# Altium footprint library HamedLib.PcbLib: 221 footprints (part 6 of 14)
Each footprint in its own frame and in the unit in brackets; x right, y up, seen from the top. Pads: shape width x height; smd on the part's side, far side on the other; paste and mask are expansions set on the pad; w line width, h text height; cw(c..) or ccw(c..) is an arc to the next point about the centre after c.
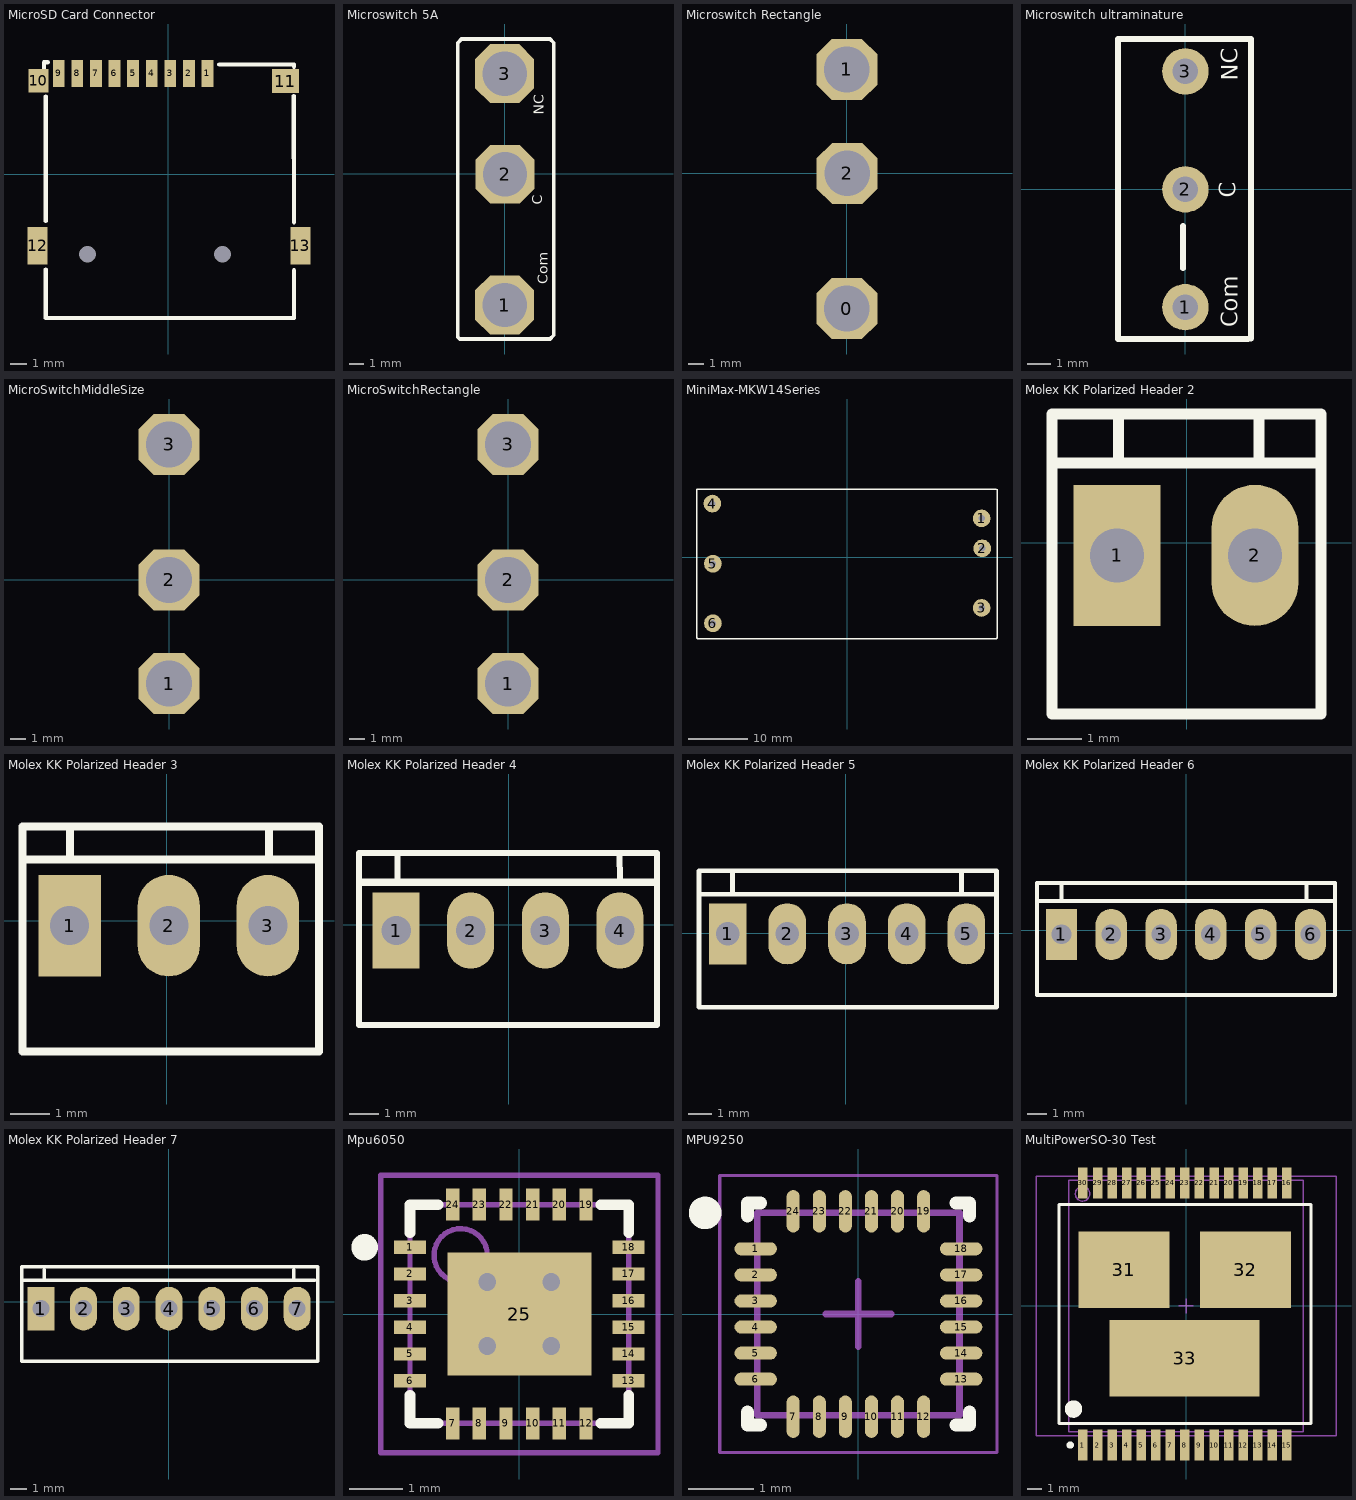
[diagram p5: the footprints below, top view; thin cyan lines are the x and y axes]

## MicroSD Card Connector [mm] "JavanElec MicroSD Card Connector"
pads (15):
  rect 0.7x1.6 smd: 1(2.328,5.961) 2(1.228,5.961) 3(0.128,5.961) 4(-0.972,5.961) 5(-2.072,5.961) 6(-3.172,5.961) 7(-4.272,5.961) 8(-5.372,5.961) 9(-6.472,5.961)
  rect 1.2x1.4 smd: 10(-7.671,5.537)
  rect 1.6x1.4 smd: 11(6.934,5.512)
  rect 1.2x2.2 smd: 12(-7.722,-4.239) 13(7.828,-4.239)
  round 0 hole 1: 14(-4.772,-4.739) 15(3.228,-4.739)
Top Overlay:
  lines w0.254: -7.341,6.261 -7.341,6.629 -7.122,6.629 ; -7.247,-5.639 -7.247,-8.514 7.453,-8.514 7.453,-5.689 ; -7.247,-2.764 -7.239,4.597 ; 3.028,6.486 7.453,6.486 7.453,6.361 ; 7.442,4.623 7.453,-2.839
3D body "User Library-micro-sd-card.step": height 2.2, standoff -0.5, extent -7.896,-10.657 8.204,6.543

## Microswitch 5A [mm]
pads (3):
  oct 4x4 hole 3: 1(0,-8.9) 2(0.025,-0.025) 3(0,6.8)
Top Overlay:
  lines w0.254: 3.325,8.775 3.325,-10.95 3.075,-11.2 -3.05,-11.2 -3.175,-11.075 -3.175,8.9 -2.925,9.15 3.075,9.15 3.325,8.9
  text "Com" at 2.925,-7.5 h0.7
  text "C" at 2.55,-2.1 h0.7
  text "NC" at 2.65,4 h0.7
3D body "Mircoswitch 5A.STEP": height 11, standoff -4.87, extent -3.15,-10.8 3.25,9.15

## Microswitch Rectangle [mm]
pads (3):
  oct 4x4 hole 3: 0(0,-8.9) 1(0,6.8) 2(0.025,-0.025)
3D body "MicroSwitch Rectangle.step": height 17.36, standoff -0.9, extent -3.15,-11.017 3.25,8.883

## Microswitch ultraminature [mm]
pads (3):
  round 2 hole 1.1: 1(0,-5.08) 2(0,0) 3(0,5.08)
Top Overlay:
  lines w0.254: -0.1,-3.4 -0.1,-1.575 ; 2.7,-6.45 -2.9,-6.45 -2.9,6.475 2.825,6.475 2.825,-6.425
  text "NC" at 2.25,4.675 h0.7
  text "C" at 2.175,-0.375 h0.7
  text "Com" at 2.25,-5.95 h0.7
3D body "UltraMiniature Microswitch.STEP": height 14.49, standoff -3.5, extent -2.9,-6.4 2.9,6.4

## MicroSwitchMiddleSize [mm]
height 22
pads (3):
  oct 4x4 hole 3: 1(0,-6.8) 2(0,0) 3(0,8.9)
3D body "MicroSwitch Rectangle3.step": height 15.36, standoff -2.9, extent -2.7,-8.975 3.7,10.925

## MicroSwitchRectangle [mm]
height 22
pads (3):
  oct 4x4 hole 3: 1(0,-6.8) 2(0,0) 3(0,8.9)
3D body "MicroSwitch Rectangle3.step": height 15.36, standoff -2.9, extent -2.945,-8.979 3.455,10.921

## MiniMax-MKW14Series [mm]
pads (6):
  round 3 hole 1.1 paste-2539.97: 1(22.8,6.6)
  round 3 hole 1.1: 2(22.9,1.5) 3(22.8,-8.6) 4(-22.9,9.1) 5(-22.8,-1.1) 6(-22.8,-11.2)
Top Overlay:
  lines w0.254: 25.3,11.5 -25.5,11.5 -25.5,-13.7 -25.4,-13.8 25.3,-13.8 25.4,-13.7 25.4,11.5
3D body "DC-DC with Heatsink?MKW40(12V&48V)+MKWI40(48V).stp": height 16.45, standoff -5.8, extent -25.475,-14.962 25.475,12.962

## Molex KK Polarized Header 2 [mm]
pads (2):
  rect 1.6x2.6 hole 1: 1(-1.28,-0.23)
  oval 1.6x2.6 hole 1: 2(1.26,-0.23)
Top Overlay:
  lines w0.203: -2.347,1.472 2.378,1.472 ; -1.255,1.472 -1.255,2.35 ; 1.336,1.472 1.336,2.375 ; -2.475,-3.15 -2.475,2.375 2.475,2.375 2.475,-3.15 -2.475,-3.15
3D body "2pin mokhaberati LHWR.stp": height 10.75, standoff -4.15, extent -2.565,-3.425 2.515,2.375

## Molex KK Polarized Header 3 [mm]
pads (3):
  rect 1.6x2.6 hole 1: 1(-2.49,-0.12)
  oval 1.6x2.6 hole 1: 2(0.05,-0.12) 3(2.59,-0.12)
Top Overlay:
  lines w0.203: -3.7,1.58 3.9,1.58 ; -2.48,1.58 -2.48,2.425 ; 2.62,1.57 2.62,2.425 ; -3.7,-3.35 -3.7,2.425 3.9,2.425 3.9,-3.35 -3.7,-3.35
3D body "3pin mokhaberati Locking Header WR-WTB .stp": height 10.75, standoff -4.15, extent -3.72,-3.35 3.9,2.45

## Molex KK Polarized Header 4 [mm]
pads (4):
  rect 1.6x2.6 hole 1: 1(-3.84,-0.2)
  oval 1.6x2.6 hole 1: 2(-1.3,-0.2) 3(1.24,-0.2) 4(3.78,-0.2)
Top Overlay:
  lines w0.203: -3.8,1.45 -3.8,2.36 ; 3.775,2.425 3.78,1.493 ; -5.1,-3.425 -5.1,2.45 5.05,2.45 5.05,-3.425 -5.1,-3.425
  lines w0.254: -5,1.45 4.925,1.45
3D body "4pin mokhaberati LHWR.stp": height 10.75, standoff -4.15, extent -5.06,-3.425 5.1,2.375

## Molex KK Polarized Header 5 [mm]
pads (5):
  rect 1.6x2.6 hole 1: 1(-5.035,-0.03)
  oval 1.6x2.6 hole 1: 2(-2.495,-0.03) 3(0.045,-0.03) 4(2.585,-0.03) 5(5.125,-0.03)
Top Overlay:
  lines w0.203: -6.175,1.663 6.325,1.65 ; -4.823,1.663 -4.823,2.6 ; 4.913,1.663 4.913,2.6 ; -6.25,-3.15 6.4,-3.15 6.4,2.65 -6.25,2.65 -6.25,-3.15
3D body "5pin mokhaberati LHWR.stp": height 10.75, standoff -4.15, extent -6.3,-3.225 6.4,2.575

## Molex KK Polarized Header 6 [mm]
pads (6):
  rect 1.6x2.6 hole 1: 1(-6.36,-0.205)
  oval 1.6x2.6 hole 1: 2(-3.82,-0.205) 3(-1.28,-0.205) 4(1.26,-0.205) 5(3.8,-0.205) 6(6.34,-0.205)
Top Overlay:
  lines w0.203: -7.6,1.488 7.6,1.488 ; -6.36,1.488 -6.36,2.3 ; 6.128,1.488 6.128,2.425 ; -7.6,-3.3 -7.6,2.425 7.6,2.425 7.6,-3.3 -7.6,-3.3
3D body "6pin mokhaberati LHWR.stp": height 10.75, standoff -4.15, extent -7.62,-3.325 7.62,2.475

## Molex KK Polarized Header 7 [mm]
pads (7):
  rect 1.6x2.6 hole 1: 1(-7.605,-0.405)
  oval 1.6x2.6 hole 1: 2(-5.065,-0.405) 3(-2.525,-0.405) 4(0.015,-0.405) 5(2.555,-0.405) 6(5.095,-0.405) 7(7.635,-0.405)
Top Overlay:
  lines w0.203: -8.663,1.288 8.693,1.288 ; -7.393,1.288 -7.393,1.923 ; 7.423,1.288 7.423,1.923 ; -8.75,-3.525 8.85,-3.525 8.85,2.075 -8.75,2.075 -8.75,-3.525
3D body "7pin mokhaberati LHWR.stp": height 10.75, standoff -4.15, extent -8.84,-3.625 8.94,2.175

## Mpu6050 [mm] "QFN, 24-Leads, Body 4.1x4.1mm (max), Pitch 0.50mm, IPC Medium Density"
height 0.95
pads (25):
  rect 0.6x0.25 smd: 1(-2.05,1.25) 2(-2.05,0.75) 3(-2.05,0.25) 4(-2.05,-0.25) 5(-2.05,-0.75) 6(-2.05,-1.25) 13(2.05,-1.25) 14(2.05,-0.75) 15(2.05,-0.25) 16(2.05,0.25) 17(2.05,0.75) 18(2.05,1.25)
  rect 0.25x0.6 smd: 7(-1.25,-2.05) 8(-0.75,-2.05) 9(-0.25,-2.05) 10(0.25,-2.05) 11(0.75,-2.05) 12(1.25,-2.05) 19(1.25,2.05) 20(0.75,2.05) 21(0.25,2.05) 22(-0.25,2.05) 23(-0.75,2.05) 24(-1.25,2.05)
  rect 2.7x2.3 smd: 25(0,0)
via -0.6,0.6 diameter 0.66 hole 0.33
via 0.6,0.6 diameter 0.66 hole 0.33
via -0.6,-0.6 diameter 0.66 hole 0.33
via 0.6,-0.6 diameter 0.66 hole 0.33
Top Overlay:
  circle w0.25: c-2.9,1.25 r0.125
  lines w0.2: -2.05,-1.525 -2.05,-2.05 -1.525,-2.05 ; -2.05,1.525 -2.05,2.05 -1.525,2.05 ; 1.525,-2.05 2.05,-2.05 2.05,-1.525 ; 1.525,2.05 2.05,2.05 2.05,1.525
Mechanical 13:
  circle w0.1: c-1.1,1.1 r0.5
  lines w0.1: -2.05,-2.05 -2.05,2.05 2.05,2.05 2.05,-2.05 -2.05,-2.05
Mechanical 15:
  lines w0.1: -0.5,0 0.5,0 ; 0,-0.5 0,0.5 ; -2.6,-2.6 -2.6,2.6 2.6,2.6 2.6,-2.6 -2.6,-2.6
3D body: height 0.95, standoff 0.05, extent -2.05,-2.05 2.05,2.05
3D body "User Library-QFN24-0_5.STEP": height 1, standoff 0, extent -2,-2 2,2

## MPU9250 [mm] "QFN, 24-Leads, Body 3.00x3.00mm, Pitch 0.40mm, IPC Medium Density"
height 1.05
pads (24):
  oval 0.65x0.2 smd: 1(-1.575,1) 2(-1.575,0.6) 3(-1.575,0.2) 4(-1.575,-0.2) 5(-1.575,-0.6) 6(-1.575,-1) 13(1.575,-1) 14(1.575,-0.6) 15(1.575,-0.2) 16(1.575,0.2) 17(1.575,0.6) 18(1.575,1)
  oval 0.2x0.65 smd: 7(-1,-1.575) 8(-0.6,-1.575) 9(-0.2,-1.575) 10(0.2,-1.575) 11(0.6,-1.575) 12(1,-1.575) 19(1,1.575) 20(0.6,1.575) 21(0.2,1.575) 22(-0.2,1.575) 23(-0.6,1.575) 24(-1,1.575)
Top Overlay:
  circle w0.25: c-2.35,1.55 r0.125
  lines w0.2: -1.7,-1.5 -1.7,-1.7 -1.5,-1.7 ; -1.7,1.5 -1.7,1.7 -1.5,1.7 ; 1.5,-1.7 1.7,-1.7 1.7,-1.5 ; 1.5,1.7 1.7,1.7 1.7,1.5
Mechanical 13:
  lines w0.1: -1.55,-1.55 1.55,-1.55 1.55,1.55 -1.55,1.55 -1.55,-1.55
Mechanical 15:
  lines w0.05: -2.125,-2.125 2.125,-2.125 2.125,2.125 -2.125,2.125 -2.125,-2.125
  lines w0.1: -0.5,0 0.5,0 ; 0,-0.5 0,0.5
3D body "User Library-QFN-16_3x3.STEP": height 0.9, standoff 0, extent -1.571,-1.5 1.471,1.542

## MultiPowerSO-30 Test [mm]
height 2.35
pads (33):
  rect 0.65x2.15 smd: 1(-7.075,-9.55) 2(-6.075,-9.55) 3(-5.075,-9.55) 4(-4.075,-9.55) 5(-3.075,-9.55) 6(-2.075,-9.55) 7(-1.075,-9.55) 8(-0.075,-9.55) 9(0.925,-9.55) 10(1.925,-9.55) 11(2.925,-9.55) 12(3.925,-9.55) 13(4.925,-9.55) 14(5.925,-9.55) 15(6.925,-9.55) 16(6.925,8.45) 17(5.925,8.45) 18(4.925,8.45) 19(3.925,8.45) 20(2.925,8.45) 21(1.925,8.45) 22(0.925,8.45) 23(-0.075,8.45) 24(-1.075,8.45) 25(-2.075,8.45) 26(-3.075,8.45) 27(-4.075,8.45) 28(-5.075,8.45) 29(-6.075,8.45) 30(-7.075,8.45)
  rect 6.23x5.25 smd: 31(-4.259,2.501) 32(4.083,2.501)
  rect 10.3x5.25 smd: 33(-0.09,-3.598)
Top Overlay:
  circle w0.25: c-7.95,-9.55 r0.125
  circle w0.6: c-7.725,-7.075 r0.3
  lines w0.2: -8.725,-8.075 8.575,-8.075 8.575,6.975 -8.725,6.975 -8.725,-8.075
Mechanical 13:
  circle w0.1: c-7.1,7.7 r0.5
  lines w0.1: -8.05,-8.65 -8.05,8.65 8.05,8.65 8.05,-8.65 -8.05,-8.65
Mechanical 15:
  lines w0.1: -0.5,0 0.5,0 ; 0,-0.5 0,0.5 ; -10.3,-8.9 -10.3,8.9 10.3,8.9 10.3,-8.9 -10.3,-8.9
3D body "SW3dPS-PowSO30-ST.STEP": height 2.37, standoff -0.09, extent -8.66,-10.02 8.54,8.98